# Altium footprint library Semicon-Discrete.pcblib: 205 footprints (part 9 of 13)
Each footprint in its own frame and in the unit in brackets; x right, y up, seen from the top. Pads: shape width x height; smd on the part's side, far side on the other; paste and mask are expansions set on the pad; w line width, h text height; cw(c..) or ccw(c..) is an arc to the next point about the centre after c.
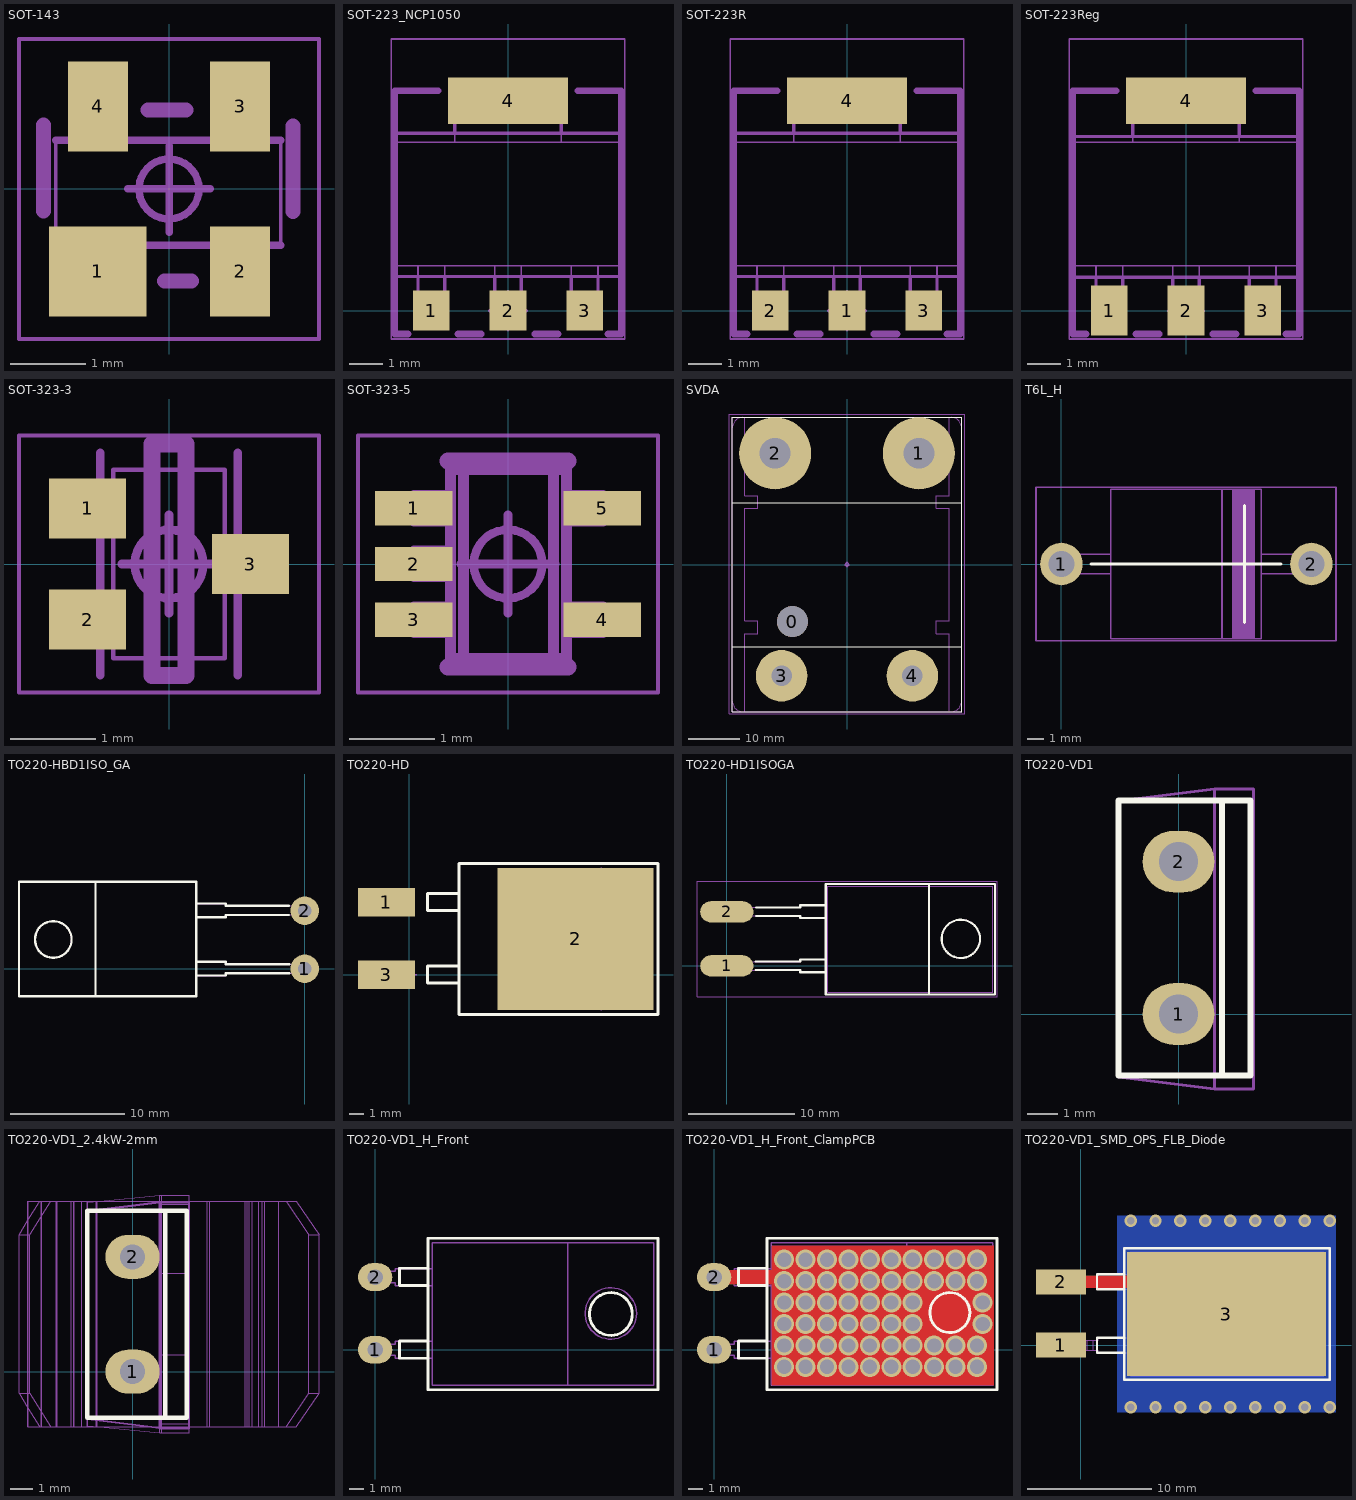
[diagram p8: the footprints below, top view; thin cyan lines are the x and y axes]

## SOT-143 [mm]
pads (4):
  rect 1.3x1.2 smd: 1(-0.95,-1.1)
  rect 0.8x1.2 smd: 2(0.95,-1.1) 3(0.95,1.1) 4(-0.95,1.1)
2-TopCompOutl:
  lines w0.05: -1.35,-0.75 -1.35,-1.35 -0.55,-1.35 -0.55,-0.75 ; -1.15,0.65 -1.15,1.25 -0.75,1.25 -0.75,0.65 ; 0.75,-0.75 0.75,-1.35 1.15,-1.35 1.15,-0.75 ; 0.75,0.65 0.75,1.25 1.15,1.25 1.15,0.65 ; -1.509,-0.75 -1.509,0.65 1.491,0.65 1.491,-0.75 -1.509,-0.75
4-TopCourty:
  circle w0.1: c0,0 r0.4
  lines w0.05: -2,-2 2,-2 2,2 -2,2 -2,-2
  lines w0.1: -0.55,0 0.55,0 ; 0,-0.575 0,0.575
7-TopAssy:
  lines w0.1: -1.509,-0.75 1.491,-0.75 ; -1.509,0.65 1.491,0.65 ; -1.35,-0.75 -1.35,-1.35 -0.55,-1.35 -0.55,-0.75 ; -1.15,0.65 -1.15,1.25 -0.75,1.25 -0.75,0.65 ; 0.75,-0.75 0.75,-1.35 1.15,-1.35 1.15,-0.75 ; 0.75,0.65 0.75,1.25 1.15,1.25 1.15,0.65
  text ".Designator" at -1.825,-0.6 h1.8
13-SMDTopOverlay:
  lines w0.2: -1.675,-0.293 -1.675,0.85 ; -0.283,1.05 0.225,1.05 ; -0.061,-1.227 0.3,-1.225 ; 1.65,-0.3 1.65,0.843
3D body "SOT-143.STEP": height 1.4, standoff 0, extent -1.5,-1.55 1.487,1.54

## SOT-223_NCP1050 [mm] "SOT 223"
height 1.75
pads (4):
  rect 1.1x1.2 smd: 1(-2.3,0) 2(0,0) 3(2.3,0)
  rect 3.6x1.4 smd: 4(0,6.3)
2-TopCompOutl:
  lines w0.05: -2.7,0.45 -1.9,0.45 ; -2.7,1.35 -2.7,-0.45 -2.3,-0.45 -1.9,-0.45 -1.9,1.35 ; -1.6,5.05 -1.6,6.85 0,6.85 1.6,6.85 1.6,5.05 ; -1.6,5.95 1.6,5.95 ; -0.4,0.45 0.4,0.45 ; -0.4,1.35 -0.4,-0.45 0,-0.45 0.4,-0.45 0.4,1.35 ; 1.9,0.45 2.7,0.45 ; 1.9,1.35 1.9,-0.45 2.3,-0.45 2.7,-0.45 2.7,1.35 ; -3.35,1.35 -3.35,5.05 0,5.05 3.35,5.05 3.35,1.35 0,1.35 -3.35,1.35
4-TopCourty:
  circle w0.1: c0,0 r0.4
  lines w0.05: -3.5,-0.85 -3.5,8.15 3.5,8.15 3.5,-0.85 -3.5,-0.85
  lines w0.1: -0.55,0 0.55,0 ; 0,-0.575 0,0.575
7-TopAssy:
  lines w0.1: -3.4,1.025 3.475,1.025 ; -3.4,5.325 3.475,5.325 ; -2.7,1.025 -2.7,0.075 -1.9,0.075 -1.9,1.025 ; -1.6,5.325 -1.6,6.275 1.6,6.275 1.6,5.325 ; -0.4,1.025 -0.4,0.075 0.4,0.075 0.4,1.025 ; 1.9,1.025 1.9,0.075 2.7,0.075 2.7,1.025
  text ".Designator" at -2.8,2.55 h2.2
13-SMDTopOverlay:
  lines w0.2: -3,-0.7 -3.4,-0.7 -3.4,6.6 -2.1,6.6 ; -1.5,-0.7 -0.8,-0.7 ; 0.8,-0.7 1.5,-0.7 ; 2.1,6.6 3.4,6.6 3.4,-0.7 3,-0.7
3D body "SOT-223R.STEP": height 1.8, standoff 0, extent -3.225,-0.325 3.275,6.675

## SOT-223R [mm] "SOT 223R - Reflow (TO-261)"
height 1.75
pads (4):
  rect 1.1x1.2 smd: 1(0,0) 2(-2.3,0) 3(2.3,0)
  rect 3.6x1.4 smd: 4(0,6.3)
2-TopCompOutl:
  lines w0.05: -2.7,0.45 -1.9,0.45 ; -2.7,1.35 -2.7,-0.45 -2.3,-0.45 -1.9,-0.45 -1.9,1.35 ; -1.6,5.05 -1.6,6.85 0,6.85 1.6,6.85 1.6,5.05 ; -1.6,5.95 1.6,5.95 ; -0.4,0.45 0.4,0.45 ; -0.4,1.35 -0.4,-0.45 0,-0.45 0.4,-0.45 0.4,1.35 ; 1.9,0.45 2.7,0.45 ; 1.9,1.35 1.9,-0.45 2.3,-0.45 2.7,-0.45 2.7,1.35 ; -3.35,1.35 0,1.35 3.35,1.35 3.35,5.05 0,5.05 -3.35,5.05 -3.35,1.35
4-TopCourty:
  circle w0.1: c0,0 r0.4
  lines w0.05: -3.5,-0.85 3.5,-0.85 3.5,8.15 -3.5,8.15 -3.5,-0.85
  lines w0.1: -0.55,0 0.55,0 ; 0,-0.575 0,0.575
7-TopAssy:
  lines w0.1: -3.4,1.025 3.475,1.025 ; -3.4,5.325 3.475,5.325 ; -2.7,1.025 -2.7,0.075 -1.9,0.075 -1.9,1.025 ; -1.6,5.325 -1.6,6.275 1.6,6.275 1.6,5.325 ; -0.4,1.025 -0.4,0.075 0.4,0.075 0.4,1.025 ; 1.9,1.025 1.9,0.075 2.7,0.075 2.7,1.025
  text ".Designator" at -2.8,2.55 h2.2
13-SMDTopOverlay:
  lines w0.2: -3,-0.7 -3.4,-0.7 -3.4,6.6 -2.1,6.6 ; -1.5,-0.7 -0.8,-0.7 ; 0.8,-0.7 1.5,-0.7 ; 2.1,6.6 3.4,6.6 3.4,-0.7 3,-0.7
3D body "SOT-223R.STEP": height 1.8, standoff 0, extent -3.225,-0.325 3.275,6.675

## SOT-223Reg [mm] "SOT 223Reg"
height 1.75
pads (4):
  rect 1.1x1.5 smd: 1(-2.3,0) 2(0,0) 3(2.3,0)
  rect 3.6x1.4 smd: 4(0,6.3)
2-TopCompOutl:
  lines w0.05: -2.7,0.45 -1.9,0.45 ; -2.7,1.35 -2.7,-0.45 -2.3,-0.45 -1.9,-0.45 -1.9,1.35 ; -1.6,5.05 -1.6,6.85 0,6.85 1.6,6.85 1.6,5.05 ; -1.6,5.95 1.6,5.95 ; -0.4,0.45 0.4,0.45 ; -0.4,1.35 -0.4,-0.45 0,-0.45 0.4,-0.45 0.4,1.35 ; 1.9,0.45 2.7,0.45 ; 1.9,1.35 1.9,-0.45 2.3,-0.45 2.7,-0.45 2.7,1.35 ; -3.35,1.35 0,1.35 3.35,1.35 3.35,5.05 0,5.05 -3.35,5.05 -3.35,1.35
4-TopCourty:
  circle w0.1: c0,0 r0.35
  lines w0.05: -3.5,-0.85 3.5,-0.85 3.5,8.15 -3.5,8.15 -3.5,-0.85
  lines w0.1: -0.525,0 0.525,0 ; 0,-0.525 0,0.525
7-TopAssy:
  lines w0.1: -3.4,5.225 3.375,5.225 ; -3.375,1 3.425,1 ; -2.7,1 -2.7,0.05 -1.9,0.05 -1.9,1 ; -1.6,5.25 -1.6,6.325 1.6,6.325 1.6,5.25 ; -0.4,1 -0.4,0.05 0.4,0.05 0.4,1 ; 1.9,1 1.9,0.05 2.7,0.05 2.7,1
  text ".Designator" at -2.625,2.575 h2.2
13-SMDTopOverlay:
  lines w0.2: -3,-0.7 -3.4,-0.7 -3.4,6.6 -2.1,6.6 ; -1.5,-0.7 -0.8,-0.7 ; 0.8,-0.7 1.5,-0.7 ; 2.1,6.6 3.4,6.6 3.4,-0.7 3,-0.7
3D body "SOT-223Reg.STEP": height 1.8, standoff 0, extent -3.2,-0.425 3.3,6.575

## SOT-323-3 [mm] "SOT-323.ogl"
height 1
pads (3):
  rect 0.9x0.7 smd: 1(-0.95,0.65) 2(-0.95,-0.65) 3(0.95,0)
2-TopCompOutl:
  lines w0.05: -0.65,-0.85 -1.1,-0.85 -1.1,-0.45 -0.65,-0.45 ; -0.65,0.45 -1.1,0.45 -1.1,0.85 -0.65,0.85 ; 0.65,-0.2 1.1,-0.2 1.1,0.2 0.65,0.2 ; -0.65,-1.1 -0.65,1.1 0.65,1.1 0.65,-1.1 -0.65,-1.1
4-TopCourty:
  circle w0.1: c0,0 r0.4
  lines w0.05: -1.75,-1.5 -1.75,1.5 1.75,1.5 1.75,-1.5 -1.75,-1.5
  lines w0.1: -0.55,0 0.55,0 ; 0,-0.575 0,0.575
7-TopAssy:
  lines w0.1: -0.8,-1.3 -0.8,1.3 ; -0.8,-0.85 -1.25,-0.85 -1.25,-0.45 -0.8,-0.45 ; -0.8,0.45 -1.25,0.45 -1.25,0.85 -0.8,0.85 ; 0.8,-1.3 0.8,1.3 ; 0.8,-0.2 1.25,-0.2 1.25,0.2 0.8,0.2
  text ".Designator" at 0.6,-1.875 h1.8
13-SMDTopOverlay:
  lines w0.2: -0.2,-1.3 0.2,-1.3 0.2,1.4 -0.2,1.4 -0.2,-1.3
3D body "SOT-323-3.STEP": height 1.2, standoff 0, extent -1.175,-1.1 1.025,1.1

## SOT-323-5 [mm] "ti_DCK (R-PDSO-G5)"
height 1.1
pads (5):
  rect 0.9x0.4 smd mask+0.05: 1(-1.1,0.65) 2(-1.1,0) 3(-1.1,-0.65) 4(1.1,-0.65) 5(1.1,0.65)
2-TopCompOutl:
  lines w0.127: -0.669,-0.799 -0.694,-0.799 ; -0.669,-0.499 -0.694,-0.499 ; -0.669,-0.149 -0.694,-0.149 ; -0.669,0.151 -0.694,0.151 ; -0.669,0.501 -0.694,0.501 ; -0.669,0.801 -0.694,0.801 ; 0.681,-0.799 0.706,-0.799 ; 0.681,-0.499 0.706,-0.499 ; 0.681,0.501 0.706,0.501 ; 0.681,0.801 0.706,0.801 ; -0.894,-0.799 -1.094,-0.799 -1.094,-0.499 -0.894,-0.499 ; -0.894,-0.799 -0.844,-0.799 ; -0.894,-0.799 -0.894,-0.499 ; -0.894,-0.499 -0.844,-0.499 ; -0.894,-0.149 -1.094,-0.149 -1.094,0.151 -0.894,0.151 ; -0.894,-0.149 -0.844,-0.149 ; -0.894,-0.149 -0.894,0.151 ; -0.894,0.151 -0.844,0.151 ; -0.894,0.501 -1.094,0.501 -1.094,0.801 -0.894,0.801 ; -0.894,0.501 -0.844,0.501 ; -0.894,0.501 -0.894,0.801 ; -0.894,0.801 -0.844,0.801 ; -0.844,-0.799 -0.694,-0.799 ; -0.844,-0.799 -0.844,-0.499 ; -0.844,-0.499 -0.694,-0.499 ; -0.844,-0.149 -0.694,-0.149 ; -0.844,-0.149 -0.844,0.151 ; -0.844,0.151 -0.694,0.151 ; -0.844,0.501 -0.694,0.501 ; -0.844,0.501 -0.844,0.801 ; -0.844,0.801 -0.694,0.801 ; -0.694,-0.799 -0.694,-0.499 ; -0.694,-0.149 -0.694,0.151 ; -0.694,0.501 -0.694,0.801 ; -0.519,-1.099 0.531,-1.099 ; -0.519,-1.099 -0.669,-1.099 -0.669,1.101 -0.519,1.101 ; -0.519,-1.099 -0.519,1.101 ; -0.519,1.101 0.531,1.101 ; 0.531,-1.099 0.681,-1.099 0.681,1.101 0.531,1.101 ; 0.531,-1.099 0.531,1.101 ; 0.706,-0.799 0.856,-0.799 ; 0.706,-0.799 0.706,-0.499 ; 0.706,-0.499 0.856,-0.499 ; 0.706,0.501 0.856,0.501 ; 0.706,0.501 0.706,0.801 ; 0.706,0.801 0.856,0.801 ; 0.856,-0.799 0.906,-0.799 ; 0.856,-0.799 0.856,-0.499 ; 0.856,-0.499 0.906,-0.499 ; 0.856,0.501 0.906,0.501 ; 0.856,0.501 0.856,0.801 ; 0.856,0.801 0.906,0.801 ; 0.906,-0.799 1.106,-0.799 1.106,-0.499 0.906,-0.499 ; 0.906,-0.799 0.906,-0.499 ; 0.906,0.501 1.106,0.501 1.106,0.801 0.906,0.801 ; 0.906,0.501 0.906,0.801
4-TopCourty:
  circle w0.1: c0,0 r0.4
  lines w0.05: -1.75,-1.5 -1.75,1.5 1.75,1.5 1.75,-1.5 -1.75,-1.5
  lines w0.1: -0.55,0 0.55,0 ; 0,-0.575 0,0.575
7-TopAssy:
  lines w0.127: -0.669,-0.799 -0.694,-0.799 ; -0.669,-0.499 -0.694,-0.499 ; -0.669,-0.149 -0.694,-0.149 ; -0.669,0.151 -0.694,0.151 ; -0.669,0.501 -0.694,0.501 ; -0.669,0.801 -0.694,0.801 ; 0.681,-0.799 0.706,-0.799 ; 0.681,-0.499 0.706,-0.499 ; 0.681,0.501 0.706,0.501 ; 0.681,0.801 0.706,0.801 ; -0.894,-0.799 -0.894,-0.499 ; -0.894,-0.799 -0.844,-0.799 ; -0.894,-0.799 -1.094,-0.799 -1.094,-0.499 -0.894,-0.499 ; -0.894,-0.499 -0.844,-0.499 ; -0.894,-0.149 -0.894,0.151 ; -0.894,-0.149 -0.844,-0.149 ; -0.894,-0.149 -1.094,-0.149 -1.094,0.151 -0.894,0.151 ; -0.894,0.151 -0.844,0.151 ; -0.894,0.501 -0.894,0.801 ; -0.894,0.501 -0.844,0.501 ; -0.894,0.501 -1.094,0.501 -1.094,0.801 -0.894,0.801 ; -0.894,0.801 -0.844,0.801 ; -0.844,-0.799 -0.844,-0.499 ; -0.844,-0.799 -0.694,-0.799 ; -0.844,-0.499 -0.694,-0.499 ; -0.844,-0.149 -0.844,0.151 ; -0.844,-0.149 -0.694,-0.149 ; -0.844,0.151 -0.694,0.151 ; -0.844,0.501 -0.844,0.801 ; -0.844,0.501 -0.694,0.501 ; -0.844,0.801 -0.694,0.801 ; -0.694,-0.799 -0.694,-0.499 ; -0.694,-0.149 -0.694,0.151 ; -0.694,0.501 -0.694,0.801 ; -0.519,-1.099 -0.519,1.101 ; -0.519,-1.099 -0.669,-1.099 -0.669,1.101 -0.519,1.101 ; -0.519,-1.099 0.531,-1.099 ; -0.519,1.101 0.531,1.101 ; 0.531,-1.099 0.531,1.101 ; 0.531,-1.099 0.681,-1.099 0.681,1.101 0.531,1.101 ; 0.706,-0.799 0.706,-0.499 ; 0.706,-0.799 0.856,-0.799 ; 0.706,-0.499 0.856,-0.499 ; 0.706,0.501 0.706,0.801 ; 0.706,0.501 0.856,0.501 ; 0.706,0.801 0.856,0.801 ; 0.856,-0.799 0.856,-0.499 ; 0.856,-0.799 0.906,-0.799 ; 0.856,-0.499 0.906,-0.499 ; 0.856,0.501 0.856,0.801 ; 0.856,0.501 0.906,0.501 ; 0.856,0.801 0.906,0.801 ; 0.906,-0.799 0.906,-0.499 ; 0.906,-0.799 1.106,-0.799 1.106,-0.499 0.906,-0.499 ; 0.906,0.501 0.906,0.801 ; 0.906,0.501 1.106,0.501 1.106,0.801 0.906,0.801
  text ".Designator" at -1.375,1.475 h1.8
13-SMDTopOverlay:
  lines w0.2: -0.7,-1.2 0.7,-1.2 ; -0.7,1.2 0.7,1.2
3D body "SOT-323-5.STEP": height 1.2, standoff 0, extent -1.1,-1.1 1.1,1.1

## SVDA [mm] "Solid State Relay"
pads (5):
  round 6 hole 6: 0(-10.6,-11.1)
  round 14 hole 6: 1(13.95,21.6) 2(-13.95,21.6)
  round 10 hole 4: 3(-12.7,-21.6) 4(12.7,-21.6)
TopOverlay:
  lines w0.2: -22.25,-16 22.25,-16 ; -22.25,12 22.25,12 ; -22.25,-28.55 22.25,-28.55 22.25,28.55 -22.25,28.55 -22.25,-28.55
2-TopCompOutl:
  lines w0.1: -22.25,-28.55 -22.25,28.55 22.25,28.55 22.25,-28.55 -22.25,-28.55
4-TopCourty:
  circle w0.1: c0,0 r0.35
  lines w0.1: -0.525,0 0.525,0 ; 0,-0.525 0,0.525 ; -22.85,-29.025 22.85,-29.025 22.85,29.225 -22.85,29.225 -22.85,-29.025
7-TopAssy:
  lines w0.1: -22.25,-26.55 -22.25,0 -22.25,26.55 ; -22.25,-26.525 ccw(c-20.238,-26.538) -20.25,-28.55 0,-28.55 20.25,-28.55 ccw(c20.238,-26.538) 22.25,-26.525 ; -22.25,26.525 cw(c-20.238,26.538) -20.25,28.55 0,28.55 20.25,28.55 cw(c20.238,26.538) 22.25,26.525 ; -19.9,-28.5 -19.9,-13.4 -17.3,-13.4 -17.3,-10.9 -19.9,-10.9 -19.9,0 -19.9,10.9 -17.3,10.9 -17.3,13.4 -19.9,13.4 -19.9,28.5 ; 19.9,-28.5 19.9,-13.4 17.3,-13.4 17.3,-10.9 19.9,-10.9 19.9,0 19.9,10.9 17.3,10.9 17.3,13.4 19.9,13.4 19.9,28.5 ; 22.25,-26.55 22.25,0 22.25,26.55
  text ".Designator" at -3.35,1.35 h1.8
3D body "SVDA.STEP": height 22.9, standoff 0, extent -22.2,-28.55 22.3,28.55

## T6L_H [mm]
pads (2):
  round 2.6 hole 1.6: 1(0,0) 2(15.25,0)
TopOverlay:
  lines w0.2: 1.8,0 13.4,0 ; 11.175,-3.55 11.175,3.55
2-TopCompOutl:
  lines w0.1: 3,-0.6 0,-0.6 0,0.6 3,0.6 ; 9.8,-4.525 9.8,4.55 ; 11.2,-4.55 11.2,4.525 ; 12.2,-0.6 15.2,-0.6 15.2,0.6 12.2,0.6 ; 3,-4.55 3,4.55 12.2,4.55 12.2,-4.55 3,-4.55
4-TopCourty:
  circle w0.1: c0,0 r0.35
  lines w0.1: -0.775,0 0.775,0 ; -0.525,0 0.525,0 ; 0,-0.8 0,0.8 ; 0,-0.525 0,0.525 ; -1.55,-4.675 -1.55,4.675 16.75,4.675 16.75,-4.675 -1.55,-4.675
7-TopAssy:
  rectangle: 10.4,-4.525 11.8,4.55
  lines w0.1: 3,-0.6 0,-0.6 0,0 0,0.6 3,0.6 ; 12.2,-0.6 15.2,-0.6 15.2,0 15.2,0.6 12.2,0.6 ; 3,-4.55 12.2,-4.55 12.2,4.55 3,4.55 3,-4.55
  text ".Designator" at 4.475,-0.6 h2.2
3D body "T6L_H.STEP": height 9.15, standoff -2.54, extent -0.65,-4.6 15.908,4.569

## TO220-HBD1ISO_GA [mm]
height 4
pads (2):
  round 2.5 hole 1.2: 1(0,0) 2(0,5.08)
TopOverlay:
  circle w0.2: c-22,2.56 r1.6
  lines w0.2: -18.3,-2.4 -18.3,7.6 ; -9.5,-0.6 -6.9,-0.6 -6.9,-0.4 -1.35,-0.4 ; -9.5,0.6 -6.9,0.6 -6.9,0.4 -1.35,0.4 ; -9.5,4.5 -6.9,4.5 -6.9,4.7 -1.4,4.7 ; -9.5,5.7 -6.9,5.7 -6.9,5.5 -1.4,5.5 ; -25,-2.4 -25,7.6 -9.5,7.6 -9.5,-2.4 -25,-2.4
2-TopCompOutl:
  circle w0.1: c-22,2.56 r1.6
  lines w0.1: -18.3,-2.4 -18.3,7.6 ; -9.5,-0.6 -6.9,-0.6 -6.9,-0.4 0,-0.4 0,0.4 -6.9,0.4 -6.9,0.6 -9.5,0.6 ; -9.5,4.5 -6.9,4.5 -6.9,4.7 0,4.7 0,5.5 -6.9,5.5 -6.9,5.7 -9.5,5.7 ; -25,-2.4 -9.5,-2.4 -9.5,7.6 -25,7.6 -25,-2.4
4-TopCourty:
  lines w0.1: -0.525,0 0.525,0 ; 0,-0.525 0,0.525
7-TopAssy:
  circle w0.1: c-22,2.56 r1.6
  lines w0.1: -18.3,-2.4 -18.3,7.6 ; -9.5,-0.6 -6.9,-0.6 -6.9,-0.4 0,-0.4 0,0.4 -6.9,0.4 -6.9,0.6 -9.5,0.6 ; -9.5,4.5 -6.9,4.5 -6.9,4.7 0,4.7 0,5.5 -6.9,5.5 -6.9,5.7 -9.5,5.7 ; -25,-2.4 -25,7.6 -9.5,7.6 -9.5,-2.4 -25,-2.4
  text ".Designator" at -19.1,2.1 h2.2

## TO220-HD [mm] "TO220 SMD"
pads (3):
  rect 4x2 smd: 1(-1.6,5.08) 3(-1.6,0)
  rect 11x10 smd: 2(11.7,2.5)
TopOverlay:
  lines w0.2: 3.5,-0.6 1.3,-0.6 1.3,0.6 3.5,0.6 ; 3.5,4.5 1.3,4.5 1.3,5.7 3.5,5.7 ; 3.5,-2.8 3.5,-0.9 3.5,5.9 3.5,7.8 17.5,7.8 17.5,-2.8 3.5,-2.8
2-TopCompOutl:
  lines w0.1: -1.6,-0.4 -1.6,0.4 ; -1.6,4.68 -1.6,5.48 ; 13.5,-2.5 13.5,7.5
4-TopCourty:
  lines w0.1: -0.525,0 0.525,0 ; 0,-0.525 0,0.525
7-TopAssy:
  text ".Designator" at 4.425,1.75 h2.2

## TO220-HD1ISOGA [mm]
height 4
pads (2):
  oval 5x2 smd: 1(0,0) 2(0,5.08)
TopOverlay:
  circle w0.2: c22,2.54 r1.8
  lines w0.2: 2.7,-0.4 6.9,-0.4 6.9,-0.6 9.275,-0.6 ; 2.7,0.4 6.9,0.4 6.9,0.6 9.275,0.6 ; 2.775,4.7 6.9,4.7 6.9,4.5 9.3,4.5 ; 2.775,5.5 6.9,5.5 6.9,5.7 9.275,5.7 ; 19,-2.7 19,7.7 ; 9.3,-2.7 9.3,7.7 25.225,7.7 25.225,-2.7 9.3,-2.7
2-TopCompOutl:
  circle w0.1: c22,2.54 r1.8
  lines w0.1: 9.5,-0.6 6.9,-0.6 6.9,-0.4 -1.3,-0.4 -1.3,0.4 6.9,0.4 6.9,0.6 9.5,0.6 ; 9.5,4.5 6.9,4.5 6.9,4.7 -1.3,4.7 -1.3,5.5 6.9,5.5 6.9,5.7 9.5,5.7 ; 19,-2.5 19,7.5 ; 9.5,-2.5 25,-2.5 25,7.5 9.5,7.5 9.5,-2.5
4-TopCourty:
  circle w0.1: c0,0 r0.35
  lines w0.1: -0.525,0 0.525,0 ; 0,-0.525 0,0.525 ; -2.8,-2.9 25.4,-2.9 25.4,7.95 -2.8,7.95 -2.8,-2.9
7-TopAssy:
  circle w0.1: c22,2.54 r1.8
  lines w0.1: -1.3,-0.4 6.9,-0.4 ; -1.3,-0.4 -1.3,0.4 ; -1.3,-0.4 -1.3,0.4 ; -1.3,-0.4 6.9,-0.4 ; -1.3,0.4 6.9,0.4 ; -1.3,0.4 6.9,0.4 ; -1.3,4.7 -1.3,5.5 ; -1.3,4.7 6.9,4.7 ; -1.3,4.7 6.9,4.7 ; -1.3,4.7 -1.3,5.5 ; -1.3,5.5 6.9,5.5 ; -1.3,5.5 6.9,5.5 ; 6.9,-0.6 9.5,-0.6 6.9,-0.6 ; 6.9,-0.6 6.9,-0.4 ; 6.9,-0.6 6.9,-0.4 ; 6.9,0.4 6.9,0.6 ; 6.9,0.4 6.9,0.6 ; 6.9,0.6 9.5,0.6 6.9,0.6 ; 6.9,4.5 6.9,4.7 ; 6.9,4.5 9.5,4.5 6.9,4.5 ; 6.9,4.5 6.9,4.7 ; 6.9,5.5 6.9,5.7 ; 6.9,5.5 6.9,5.7 ; 6.9,5.7 9.5,5.7 6.9,5.7 ; 9.5,-2.5 25,-2.5 ; 9.5,-2.5 9.5,7.5 ; 9.5,-2.5 9.5,7.5 ; 9.5,-2.5 25,-2.5 ; 9.5,7.5 25,7.5 ; 9.5,7.5 25,7.5 ; 25,-2.5 25,7.5 ; 25,-2.5 25,7.5 ; 19,-2.5 19,7.5 19,-2.5
  text ".Designator" at 10.575,1.7 h2.2

## TO220-VD1 [mm]
pads (2):
  oval 2.4x2.05 hole 1.3: 1(0,0) 2(0,5.08)
TopOverlay:
  lines w0.2: 1.45,-2.05 1.45,7.125 ; -2,-2.05 -2,7.125 2.4,7.125 2.4,-2.05 -2,-2.05
2-TopCompOutl:
  lines w0.1: -2,2.5 -2,-2.1 1.2,-2.5 ; -2,2.5 -2,7.1 1.2,7.5 ; 1.2,-2.5 2.5,-2.5 2.5,7.5 1.2,7.5 ; 1.2,-2.5 1.2,7.5
4-TopCourty:
  lines w0.1: -0.525,0 0.525,0 ; 0,-0.525 0,0.525
7-TopAssy:
  circle w0.1: c0,0 r0.27
  circle w0.1: c0,5.08 r0.27
  lines w0.1: -2,2.5 -2,-2.1 1.2,-2.5 ; -2,2.5 -2,7.1 1.2,7.5 ; 1.2,-2.5 1.2,7.5 ; 1.2,-2.5 2.5,-2.5 2.5,7.5 1.2,7.5
  text ".Designator" at 0.55,0.325 h2.2
3D body "TO220-VD1.STEP": height 25.85, standoff -3.2, extent -1.95,-5 2.8,10

## TO220-VD1_2.4kW-2mm [mm] "CXRF 2.4kw"
pads (2):
  oval 2.4x1.95 hole 1.1: 1(0,0) 2(0,5.08)
TopOverlay:
  lines w0.2: 1.45,-2.05 1.45,7.125 ; -2,-2.05 2.4,-2.05 2.4,7.125 -2,7.125 -2,-2.05
2-TopCompOutl:
  lines w0.1: -2,2.5 -2,-2.1 1.2,-2.5 ; -2,2.5 -2,7.1 1.2,7.5 ; 1.2,-2.5 1.2,7.5 ; 1.2,-2.5 2.5,-2.5 2.5,7.5 1.2,7.5
4-TopCourty:
  lines w0.1: -0.525,0 0.525,0 ; 0,-0.525 0,0.525
5-MCadOutl:
  lines w0: -4.626,-2.45 -4.626,7.55 ; -4.104,-2.45 -4.635,-1.588 -5.028,-0.95 ; -4.104,7.55 -4.635,6.688 -5.028,6.05 ; -4.035,-2.45 -4.035,7.55 ; -4.031,-2.45 -4.031,7.55 ; -3.632,-2.45 -4.555,-0.95 ; -3.632,7.55 -4.555,6.05 ; -3.383,-2.45 -3.383,7.55 ; -2.718,-2.45 -2.718,7.55 ; -2.595,-2.45 -2.595,7.55 ; -2.591,-2.45 -2.591,7.55 ; -2.245,-2.45 -2.245,7.55 ; -2,-2.45 -2,-2.4 ; -2,7.55 -2,7.5 ; -1.991,-2.45 -1.991,7.55 ; -1.611,-2.45 -1.611,7.55 ; -0.4,-0.39 0.2,-0.39 ; -0.4,0.41 0.2,0.41 ; -0.4,4.69 0.2,4.69 ; -0.4,5.49 0.2,5.49 ; 1.3,-2.3 2.5,-2.3 ; 1.3,0.75 2.5,0.75 ; 1.3,4.35 2.5,4.35 ; 1.3,7.4 2.5,7.4 ; 2.5,-1.5 2.499,-1.5 ; 2.5,6.6 2.499,6.6 ; 3.407,-2.45 3.407,7.55 ; 4.984,-2.45 4.984,7.55 ; 4.986,-2.45 4.986,7.55 ; 5.165,-2.45 5.165,7.55 ; 5.292,-2.45 5.292,7.55 ; 5.738,-2.45 5.738,7.55 ; 5.858,-2.45 5.858,7.55 ; 5.858,-2.45 5.858,7.55 ; 6.457,-2.45 6.457,7.55 ; 6.799,-2.45 7.802,-0.95 ; 6.799,7.55 7.802,6.05 ; -5.028,-0.95 -4.555,-0.95 ; -5.028,-0.95 -5.028,6.05 ; -5.028,6.05 -4.555,6.05 ; -4.555,-0.95 -4.555,6.05 ; -3.33,-2.45 -1.558,-2.45 ; -3.33,-2.45 -3.33,7.55 ; -3.33,-2.45 -4.635,-2.45 -4.635,7.55 -3.33,7.55 ; -3.33,7.55 -1.558,7.55 ; -2,-2.4 -2,7.5 ; -2,-2.4 -1.467,-2.45 1.2,-2.7 ; -2,7.5 -1.467,7.55 1.2,7.8 ; -1.558,-2.45 -1.558,7.55 ; -1.558,-2.45 3.314,-2.45 ; -1.558,7.55 3.314,7.55 ; 1.2,-2.7 2.499,-2.7 ; 1.2,-2.7 1.2,-2.45 1.2,7.55 1.2,7.8 ; 1.2,7.8 2.499,7.8 ; 2.499,-2.7 2.499,-2.699 ; 2.499,-2.7 2.5,-2.7 2.5,-2.45 2.5,7.55 2.5,7.8 2.499,7.8 ; 2.499,-2.699 2.499,-1.5 ; 2.499,-2.699 1.3,-2.699 1.3,-2.45 1.3,7.55 1.3,7.799 2.499,7.799 ; 2.499,-1.5 2.499,6.6 ; 2.499,6.6 2.499,7.799 ; 2.499,7.799 2.499,7.8 ; 3.314,-2.45 3.314,7.55 ; 3.314,-2.45 5.071,-2.45 ; 3.314,7.55 5.071,7.55 ; 5.071,-2.45 6.458,-2.45 ; 5.071,-2.45 5.071,7.55 ; 5.071,7.55 6.458,7.55 ; 6.458,-2.45 7.245,-2.45 8.248,-0.95 ; 6.458,-2.45 6.458,7.55 ; 6.458,7.55 7.245,7.55 8.248,6.05 ; 7.802,-0.95 7.802,6.05 ; 7.802,-0.95 8.248,-0.95 ; 7.802,6.05 8.248,6.05 ; 8.248,-0.95 8.248,6.05 ; -0.4,-0.69 -0.4,0.71 0.2,0.71 0.2,-0.69 -0.4,-0.69 ; -0.4,4.39 0.2,4.39 0.2,5.79 -0.4,5.79 -0.4,4.39 ; 5.584,-2.45 5.584,7.55 5.585,-2.45
7-TopAssy:
  lines w0.1: -2,2.5 -2,-2.1 1.2,-2.5 ; -2,2.5 -2,7.1 1.2,7.5 ; 1.2,-2.5 2.5,-2.5 2.5,7.5 1.2,7.5 ; 1.2,-2.5 1.2,7.5
  text ".Designator" at 0.725,0.65 h2.2
3D body "TO220-VD1_2.4kW-2mm.STEP": height 29.68, standoff -3.2, extent -4.9,-2.7 8.376,7.8

## TO220-VD1_H_Front [mm]
pads (2):
  oval 2.4x1.95 hole 1.1: 1(0,0) 2(0,5.08)
TopOverlay:
  circle w0.2: c16.5,2.5 r1.5
  lines w0.2: 3.7,-0.6 1.7,-0.6 1.7,0.6 3.7,0.6 ; 3.7,4.5 1.7,4.5 1.7,5.7 3.7,5.7 ; 3.7,-2.8 19.8,-2.8 19.8,7.8 3.7,7.8 3.7,5.9 3.7,-0.9 3.7,-2.8
2-TopCompOutl:
  circle w0.1: c16.5,2.54 r1.8
  lines w0.1: 4,-0.6 1.4,-0.6 1.4,-0.4 0,-0.4 0,0.4 1.4,0.4 1.4,0.6 4,0.6 ; 4,4.48 1.4,4.48 1.4,4.68 0,4.68 0,5.48 1.4,5.48 1.4,5.68 4,5.68 ; 13.5,-2.5 13.5,7.5 ; 4,-2.5 19.5,-2.5 19.5,7.5 4,7.5 4,-2.5
4-TopCourty:
  lines w0.1: -0.525,0 0.525,0 ; 0,-0.525 0,0.525
7-TopAssy:
  text ".Designator" at 5.475,1.85 h2.2

## TO220-VD1_H_Front_ClampPCB [mm]
pads (2):
  oval 2.4x1.95 hole 1.1: 1(0,0) 2(0,5.08)
via 4.9,6.3 diameter 1.4 hole 1
via 6.4,6.3 diameter 1.4 hole 1
via 7.9,6.3 diameter 1.4 hole 1
via 9.4,6.3 diameter 1.4 hole 1
via 10.9,6.3 diameter 1.4 hole 1
via 12.4,6.3 diameter 1.4 hole 1
via 13.9,6.3 diameter 1.4 hole 1
via 15.4,6.3 diameter 1.4 hole 1
via 16.9,6.3 diameter 1.4 hole 1
via 18.4,6.3 diameter 1.4 hole 1
via 4.9,4.8 diameter 1.4 hole 1
via 6.4,4.8 diameter 1.4 hole 1
via 7.9,4.8 diameter 1.4 hole 1
via 9.4,4.8 diameter 1.4 hole 1
via 10.9,4.8 diameter 1.4 hole 1
via 12.4,4.8 diameter 1.4 hole 1
via 13.9,4.8 diameter 1.4 hole 1
via 15.4,4.8 diameter 1.4 hole 1
via 16.9,4.8 diameter 1.4 hole 1
via 18.4,4.8 diameter 1.4 hole 1
via 4.9,3.3 diameter 1.4 hole 1
via 6.4,3.3 diameter 1.4 hole 1
via 7.9,3.3 diameter 1.4 hole 1
via 9.4,3.3 diameter 1.4 hole 1
via 10.9,3.3 diameter 1.4 hole 1
via 12.4,3.3 diameter 1.4 hole 1
via 13.9,3.3 diameter 1.4 hole 1
via 18.8,3.3 diameter 1.4 hole 1
via 4.9,1.8 diameter 1.4 hole 1
via 6.4,1.8 diameter 1.4 hole 1
via 7.9,1.8 diameter 1.4 hole 1
via 9.4,1.8 diameter 1.4 hole 1
via 10.9,1.8 diameter 1.4 hole 1
via 12.4,1.8 diameter 1.4 hole 1
via 13.9,1.8 diameter 1.4 hole 1
via 18.8,1.8 diameter 1.4 hole 1
via 4.9,0.3 diameter 1.4 hole 1
via 6.4,0.3 diameter 1.4 hole 1
via 7.9,0.3 diameter 1.4 hole 1
via 9.4,0.3 diameter 1.4 hole 1
via 10.9,0.3 diameter 1.4 hole 1
via 12.4,0.3 diameter 1.4 hole 1
via 13.9,0.3 diameter 1.4 hole 1
via 15.4,0.3 diameter 1.4 hole 1
via 16.9,0.3 diameter 1.4 hole 1
via 18.4,0.3 diameter 1.4 hole 1
via 4.9,-1.2 diameter 1.4 hole 1
via 6.4,-1.2 diameter 1.4 hole 1
via 7.9,-1.2 diameter 1.4 hole 1
via 9.4,-1.2 diameter 1.4 hole 1
via 10.9,-1.2 diameter 1.4 hole 1
via 12.4,-1.2 diameter 1.4 hole 1
via 13.9,-1.2 diameter 1.4 hole 1
via 15.4,-1.2 diameter 1.4 hole 1
via 16.9,-1.2 diameter 1.4 hole 1
via 18.4,-1.2 diameter 1.4 hole 1
TopLayer:
  rectangle: 4,-2.5 19.6,7.3
  lines w1: 0,5.08 4.9,5.08
BottomLayer:
  rectangle: 4,-2.5 19.6,7.3
TopOverlay:
  circle w0.2: c16.5,2.6 r1.4
  lines w0.2: 3.7,-0.6 1.7,-0.6 1.7,0.6 3.7,0.6 ; 3.7,4.5 1.7,4.5 1.7,5.7 3.7,5.7 ; 3.7,-2.8 19.8,-2.8 19.8,7.8 3.7,7.8 3.7,5.9 3.7,-0.9 3.7,-2.8
TopSolder:
  rectangle: 4,-2.6 19.5,7.5
2-TopCompOutl:
  circle w0.1: c16.5,2.54 r1.8
  lines w0.1: 4,-0.6 1.4,-0.6 1.4,-0.4 0,-0.4 0,0.4 1.4,0.4 1.4,0.6 4,0.6 ; 4,4.48 1.4,4.48 1.4,4.68 0,4.68 0,5.48 1.4,5.48 1.4,5.68 4,5.68 ; 13.5,-2.5 13.5,7.5 ; 4,-2.5 19.5,-2.5 19.5,7.5 4,7.5 4,-2.5
4-TopCourty:
  lines w0.1: -0.525,0 0.525,0 ; 0,-0.525 0,0.525
7-TopAssy:
  text ".Designator" at 5.55,1.725 h2.2
16-Mechanical16:
  circle w0.1: c0,0 r0.6
  circle w0.1: c0,5.08 r0.6

## TO220-VD1_SMD_OPS_FLB_Diode [mm] "TO220 SMD, 4layerPCB, Mid1 used as a shield, Mid2 and Bottom connected to Earth"
pads (3):
  rect 4x2 smd: 1(-1.6,0) 2(-1.6,5.08)
  rect 16x10 smd: 3(11.7,2.5)
via 4,-5 diameter 1 hole 0.6
via 6,-5 diameter 1 hole 0.6
via 8,-5 diameter 1 hole 0.6
via 10,-5 diameter 1 hole 0.6
via 12,-5 diameter 1 hole 0.6
via 14,-5 diameter 1 hole 0.6
via 16,-5 diameter 1 hole 0.6
via 18,-5 diameter 1 hole 0.6
via 20,-5 diameter 1 hole 0.6
via 20,10 diameter 1 hole 0.6
via 18,10 diameter 1 hole 0.6
via 16,10 diameter 1 hole 0.6
via 14,10 diameter 1 hole 0.6
via 12,10 diameter 1 hole 0.6
via 10,10 diameter 1 hole 0.6
via 8,10 diameter 1 hole 0.6
via 6,10 diameter 1 hole 0.6
via 4,10 diameter 1 hole 0.6
TopLayer:
  lines w1: -1.6,5.08 11.7,5.08 11.7,2.5
MidLayer1:
  rectangle: 2.9,-5.4 20.5,10.5
MidLayer2:
  rectangle: 2,-2.8 19.6,7.6
BottomLayer:
  rectangle: 2.9,-5.4 20.5,10.4
TopOverlay:
  lines w0.2: 3.5,-0.6 1.3,-0.6 1.3,0.6 3.5,0.6 ; 3.5,4.5 1.3,4.5 1.3,5.7 3.5,5.7 ; 3.5,-2.8 3.5,-0.9 3.5,5.9 3.5,7.8 20,7.8 20,-2.8 3.5,-2.8
TopSolder:
  rectangle: 4,-2.6 19.5,7.5
2-TopCompOutl:
  circle w0.1: c16.5,2.54 r1.8
  lines w0.1: 0.5,-0.4 0.5,0.4 ; 0.5,4.68 0.5,5.48 ; 1,-0.4 1,0.4 ; 1,4.68 1,5.48 ; 4,-0.6 1.4,-0.6 1.4,-0.4 -1.6,-0.4 -1.6,0.4 1.4,0.4 1.4,0.6 4,0.6 ; 4,4.48 1.4,4.48 1.4,4.68 -1.6,4.68 -1.6,5.48 1.4,5.48 1.4,5.68 4,5.68 ; 13.5,-2.5 13.5,7.5 ; 4,-2.5 4,7.5 19.5,7.5 19.5,-2.5 4,-2.5
7-TopAssy:
  text ".Designator" at 4.925,1.725 h2.2